# Altium footprint library con-molex.PCBLIB: 368 footprints (part 4 of 26)
Each footprint in its own frame and in the unit in brackets; x right, y up, seen from the top. Pads: shape width x height; smd on the part's side, far side on the other; paste and mask are expansions set on the pad; w line width, h text height; cw(c..) or ccw(c..) is an arc to the next point about the centre after c.
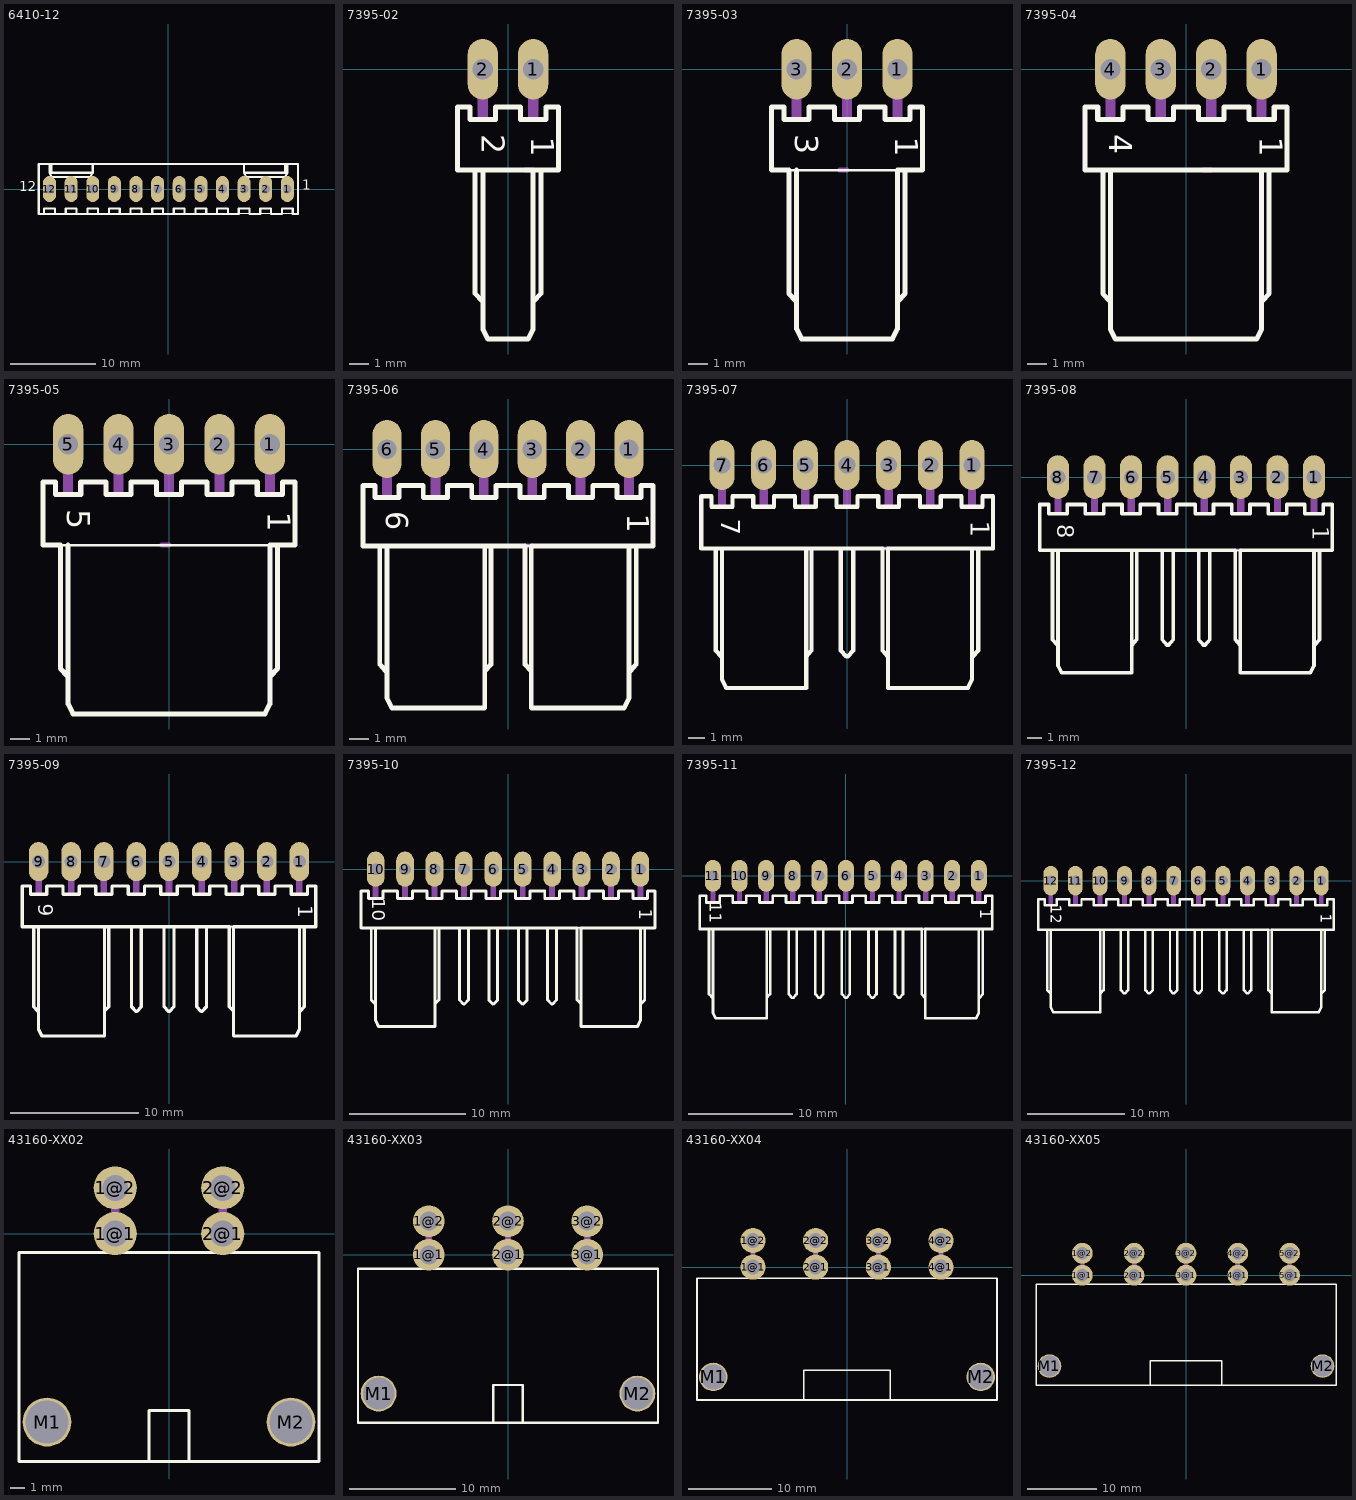
[diagram p3: the footprints below, top view; thin cyan lines are the x and y axes]

## 6410-12 [mil]
pads (12):
  oval 60x120 hole 40: 1(550,0) 2(450,0) 3(350,0) 4(250,0) 5(150,0) 6(50,0) 7(-50,0) 8(-150,0) 9(-250,0) 10(-350,0) 11(-450,0) 12(-550,0)
Top Overlay:
  lines w5: -550,100 -550,115 ; -305,-115 600,-115
  lines w10: -590,-115 -575,-115 -575,-90 -525,-90 -525,-115 -475,-115 -475,-90 -425,-90 -425,-115 -375,-115 -375,-90 -325,-90 -325,-115 325,-115 325,-90 375,-90 375,-115 425,-115 425,-90 475,-90 475,-115 525,-115 525,-90 575,-90 575,-115 600,-115 600,0 600,115 -300,115 -350,115 ; -305,-115 -600,-115 -600,0 -600,115 -550,115 ; -275,-115 -275,-90 -225,-90 -225,-115 ; -175,-115 -175,-90 -125,-90 -125,-115 ; -75,-115 -75,-90 -25,-90 -25,-115 ; 25,-115 25,-90 75,-90 75,-115 ; 125,-115 125,-90 175,-90 175,-115 ; 225,-115 225,-90 275,-90 275,-115 ; 350,115 350,75 ; 540,115 540,75 ; 550,115 550,75 ; -550,75 -550,115 ; -550,75 -540,75 ; -550,75 -540,55 -360,55 -350,75 ; -550,115 -540,115 ; -540,75 -350,75 ; -540,75 -540,115 ; -540,115 -350,115 ; -350,75 -350,115 ; 350,75 540,75 ; 350,75 360,55 540,55 550,75 ; 540,75 550,75
  text "1" at 618.94,-19.06 h77.5
  text "12" at -691.06,-27.06 h77.5
Mechanical 16:
  rectangle: -560,-10 -540,10
  rectangle: -460,-10 -440,10
  rectangle: -360,-10 -340,10
  rectangle: 340,-10 360,10
  rectangle: 440,-10 460,10
  rectangle: 540,-10 560,10
  rectangle: -260,-10 -240,10
  rectangle: 240,-10 260,10
  rectangle: 140,-10 160,10
  rectangle: -160,-10 -140,10
  rectangle: -60,-10 -40,10
  rectangle: 40,-10 60,10

## 7395-02 [mil]
pads (2):
  oval 60x120 hole 40: 1(50,0) 2(-50,0)
Top Overlay:
  lines w10: -52,-459 -65,-445 -65,-200 ; -50,-200 -50,-515 -40,-535 -2,-535 ; 2,-535 -2,-535 ; 52,-459 65,-445 65,-200 ; -65,-200 -100,-200 -100,-75 -75,-75 -75,-100 -25,-100 -25,-75 25,-75 25,-100 75,-100 75,-75 100,-75 100,-200 50,-200 ; -65,-200 50,-200 ; -2,-535 40,-535 50,-515 50,-200
  text "1" at 30.94,-133.94 h77.5
  text "2" at -67.06,-128.94 h77.5
Mechanical 16:
  rectangle: 40,-10 60,10
  rectangle: -60,-10 -40,10
  rectangle: 40,-99 60,-11
  rectangle: -60,-99 -40,-11
  lines w10: 35,-200 50,-200

## 7395-03 [mil]
pads (3):
  oval 60x120 hole 40: 1(100,0) 2(0,0) 3(-100,0)
Top Overlay:
  lines w5: -115,-200 100,-200
  lines w10: -102,-459 -115,-445 -115,-200 -150,-200 -150,-75 -125,-75 -125,-100 -75,-100 -75,-75 -25,-75 -25,-100 25,-100 25,-75 75,-75 75,-100 125,-100 125,-75 150,-75 150,-200 100,-200 100,-515 90,-535 -52,-535 ; -100,-200 -100,-515 -90,-535 -48,-535 ; 102,-459 115,-445 115,-200
  text "1" at 80.94,-133.94 h77.5
  text "3" at -117.06,-128.94 h77.5
Mechanical 16:
  rectangle: 90,-10 110,10
  rectangle: -10,-10 10,10
  rectangle: -110,-10 -90,10
  rectangle: 90,-99 110,-11
  rectangle: -10,-99 10,-11
  rectangle: -110,-99 -90,-11
  lines w10: -15,-200 0,-200

## 7395-04 [mil]
pads (4):
  oval 60x120 hole 40: 1(150,0) 2(50,0) 3(-50,0) 4(-150,0)
Top Overlay:
  lines w10: -152,-459 -165,-445 -165,-200 ; -150,-200 -150,-515 -140,-535 2,-535 ; -2,-535 140,-535 150,-515 150,-200 ; 152,-459 165,-445 165,-200 ; -165,-200 -200,-200 -200,-75 -175,-75 -175,-100 -125,-100 -125,-75 -75,-75 -75,-100 -25,-100 -25,-75 25,-75 25,-100 75,-100 75,-75 125,-75 125,-100 175,-100 175,-75 200,-75 200,-200 150,-200 ; -165,-200 150,-200
  text "1" at 130.94,-133.94 h77.5
  text "4" at -167.06,-128.94 h77.5
Mechanical 16:
  rectangle: 140,-10 160,10
  rectangle: 40,-10 60,10
  rectangle: -60,-10 -40,10
  rectangle: -160,-10 -140,10
  rectangle: 140,-99 160,-11
  rectangle: 40,-99 60,-11
  rectangle: -60,-99 -40,-11
  rectangle: -160,-99 -140,-11
  lines w10: 35,-200 50,-200

## 7395-05 [mil]
pads (5):
  oval 60x120 hole 40: 1(200,0) 2(100,0) 3(0,0) 4(-100,0) 5(-200,0)
Top Overlay:
  lines w5: -215,-200 200,-200
  lines w10: -202,-459 -215,-445 -215,-200 -250,-200 -250,-75 -225,-75 -225,-100 -175,-100 -175,-75 -125,-75 -125,-100 -75,-100 -75,-75 -25,-75 -25,-100 25,-100 25,-75 75,-75 75,-100 125,-100 125,-75 175,-75 175,-100 225,-100 225,-75 250,-75 250,-200 200,-200 200,-515 190,-535 -2,-535 ; -200,-200 -200,-515 -190,-535 2,-535 ; 202,-459 215,-445 215,-200
  text "1" at 180.94,-133.94 h77.5
  text "5" at -217.06,-128.94 h77.5
Mechanical 16:
  rectangle: 190,-10 210,10
  rectangle: 90,-10 110,10
  rectangle: -10,-10 10,10
  rectangle: -110,-10 -90,10
  rectangle: -210,-10 -190,10
  rectangle: 190,-99 210,-11
  rectangle: 90,-99 110,-11
  rectangle: -10,-99 10,-11
  rectangle: -110,-99 -90,-11
  rectangle: -210,-99 -190,-11
  lines w10: -15,-200 0,-200

## 7395-06 [mil]
pads (6):
  oval 60x120 hole 40: 1(250,0) 2(150,0) 3(50,0) 4(-50,0) 5(-150,0) 6(-250,0)
Top Overlay:
  lines w5: 35,-200 48,-200
  lines w10: -252,-459 -265,-445 -265,-200 ; -250,-200 -250,-515 -240,-535 -48,-535 -48,-200 ; -48,-459 -35,-445 -35,-200 ; 252,-459 265,-445 265,-200 ; -265,-200 -300,-200 -300,-75 -275,-75 -275,-100 -225,-100 -225,-75 -175,-75 -175,-100 -125,-100 -125,-75 -75,-75 -75,-100 -25,-100 -25,-75 25,-75 25,-100 75,-100 75,-75 125,-75 125,-100 175,-100 175,-75 225,-75 225,-100 275,-100 275,-75 300,-75 300,-200 250,-200 ; -265,-200 35,-200 35,-445 48,-459 ; 48,-459 48,-535 240,-535 250,-515 250,-200 ; 48,-459 48,-200 250,-200
  text "1" at 230.94,-133.94 h77.5
  text "6" at -267.06,-128.94 h77.5
Mechanical 16:
  rectangle: 240,-10 260,10
  rectangle: 140,-10 160,10
  rectangle: 40,-10 60,10
  rectangle: -60,-10 -40,10
  rectangle: -160,-10 -140,10
  rectangle: -260,-10 -240,10
  rectangle: 240,-99 260,-11
  rectangle: 140,-99 160,-11
  rectangle: 40,-99 60,-11
  rectangle: -60,-99 -40,-11
  rectangle: -160,-99 -140,-11
  rectangle: -260,-99 -240,-11
  lines w10: 35,-200 50,-200

## 7395-07 [mil]
pads (7):
  oval 60x120 hole 40: 1(300,0) 2(200,0) 3(100,0) 4(0,0) 5(-100,0) 6(-200,0) 7(-300,0)
Top Overlay:
  lines w5: 85,-200 98,-200
  lines w10: -302,-459 -315,-445 -315,-200 ; -300,-200 -300,-515 -290,-535 -98,-535 -98,-200 ; -98,-459 -85,-445 -85,-200 ; -2,-459 -15,-445 -15,-200 ; 2,-459 15,-445 15,-200 ; 302,-459 315,-445 315,-200 ; -315,-200 -350,-200 -350,-75 -325,-75 -325,-100 -275,-100 -275,-75 -225,-75 -225,-100 -175,-100 -175,-75 -125,-75 -125,-100 -75,-100 -75,-75 -25,-75 -25,-100 25,-100 25,-75 75,-75 75,-100 125,-100 125,-75 175,-75 175,-100 225,-100 225,-75 275,-75 275,-100 325,-100 325,-75 350,-75 350,-200 300,-200 ; -315,-200 -15,-200 ; -15,-200 85,-200 85,-445 98,-459 ; 98,-459 98,-535 290,-535 300,-515 300,-200 ; 98,-459 98,-200 300,-200
  text "1" at 280.94,-133.94 h77.5
  text "7" at -317.06,-128.94 h77.5
Mechanical 16:
  rectangle: 290,-10 310,10
  rectangle: 190,-10 210,10
  rectangle: 90,-10 110,10
  rectangle: -110,-10 -90,10
  rectangle: -210,-10 -190,10
  rectangle: -310,-10 -290,10
  rectangle: 290,-99 310,-11
  rectangle: 190,-99 210,-11
  rectangle: 90,-99 110,-11
  rectangle: -110,-99 -90,-11
  rectangle: -210,-99 -190,-11
  rectangle: -310,-99 -290,-11
  rectangle: -10,-99 10,-11
  rectangle: -10,-10 10,10
  lines w10: 85,-200 100,-200

## 7395-08 [mil]
pads (8):
  oval 60x120 hole 40: 1(350,0) 2(250,0) 3(150,0) 4(50,0) 5(-50,0) 6(-150,0) 7(-250,0) 8(-350,0)
Top Overlay:
  lines w5: 135,-200 148,-200
  lines w10: -352,-459 -365,-445 -365,-200 ; -350,-200 -350,-515 -340,-535 -148,-535 -148,-200 ; -148,-459 -135,-445 -135,-200 ; -52,-459 -65,-445 -65,-200 ; -48,-459 -35,-445 -35,-200 ; 48,-459 35,-445 35,-200 ; 52,-459 65,-445 65,-200 ; 352,-459 365,-445 365,-200 ; -365,-200 -400,-200 -400,-75 -375,-75 -375,-100 -325,-100 -325,-75 -275,-75 -275,-100 -225,-100 -225,-75 -175,-75 -175,-100 -125,-100 -125,-75 -75,-75 -75,-100 -25,-100 -25,-75 25,-75 25,-100 75,-100 75,-75 125,-75 125,-100 175,-100 175,-75 225,-75 225,-100 275,-100 275,-75 325,-75 325,-100 375,-100 375,-75 400,-75 400,-200 350,-200 ; -365,-200 -65,-200 ; -65,-200 35,-200 ; 35,-200 135,-200 135,-445 148,-459 ; 148,-459 148,-535 340,-535 350,-515 350,-200 ; 148,-459 148,-200 350,-200
  text "1" at 330.94,-133.94 h77.5
  text "8" at -367.06,-128.94 h77.5
Mechanical 16:
  rectangle: 340,-10 360,10
  rectangle: 240,-10 260,10
  rectangle: 140,-10 160,10
  rectangle: -160,-10 -140,10
  rectangle: -260,-10 -240,10
  rectangle: -360,-10 -340,10
  rectangle: 340,-99 360,-11
  rectangle: 240,-99 260,-11
  rectangle: 140,-99 160,-11
  rectangle: -160,-99 -140,-11
  rectangle: -260,-99 -240,-11
  rectangle: -360,-99 -340,-11
  rectangle: 40,-99 60,-11
  rectangle: 40,-10 60,10
  rectangle: -60,-99 -40,-11
  rectangle: -60,-10 -40,10
  lines w10: 135,-200 150,-200

## 7395-09 [mil]
pads (9):
  oval 60x120 hole 40: 1(400,0) 2(300,0) 3(200,0) 4(100,0) 5(0,0) 6(-100,0) 7(-200,0) 8(-300,0) 9(-400,0)
Top Overlay:
  lines w5: 185,-200 198,-200
  lines w10: -402,-459 -415,-445 -415,-200 ; -400,-200 -400,-515 -390,-535 -198,-535 -198,-200 ; -198,-459 -185,-445 -185,-200 ; -102,-459 -115,-445 -115,-200 ; -98,-459 -85,-445 -85,-200 ; -2,-459 -15,-445 -15,-200 ; 2,-459 15,-445 15,-200 ; 98,-459 85,-445 85,-200 ; 102,-459 115,-445 115,-200 ; 402,-459 415,-445 415,-200 ; -415,-200 -450,-200 -450,-75 -425,-75 -425,-100 -375,-100 -375,-75 -325,-75 -325,-100 -275,-100 -275,-75 -225,-75 -225,-100 -175,-100 -175,-75 -125,-75 -125,-100 -75,-100 -75,-75 -25,-75 -25,-100 25,-100 25,-75 75,-75 75,-100 125,-100 125,-75 175,-75 175,-100 225,-100 225,-75 275,-75 275,-100 325,-100 325,-75 375,-75 375,-100 425,-100 425,-75 450,-75 450,-200 400,-200 ; -415,-200 -115,-200 ; -115,-200 -15,-200 ; -15,-200 85,-200 ; 85,-200 185,-200 185,-445 198,-459 ; 198,-459 198,-535 390,-535 400,-515 400,-200 ; 198,-459 198,-200 400,-200
  text "1" at 380.94,-133.94 h77.5
  text "9" at -417.06,-128.94 h77.5
Mechanical 16:
  rectangle: 390,-10 410,10
  rectangle: 290,-10 310,10
  rectangle: 190,-10 210,10
  rectangle: -210,-10 -190,10
  rectangle: -310,-10 -290,10
  rectangle: -410,-10 -390,10
  rectangle: 390,-99 410,-11
  rectangle: 290,-99 310,-11
  rectangle: 190,-99 210,-11
  rectangle: -210,-99 -190,-11
  rectangle: -310,-99 -290,-11
  rectangle: -410,-99 -390,-11
  rectangle: 90,-99 110,-11
  rectangle: 90,-10 110,10
  rectangle: -10,-99 10,-11
  rectangle: -10,-10 10,10
  rectangle: -110,-99 -90,-11
  rectangle: -110,-10 -90,10
  lines w10: 185,-200 200,-200

## 7395-10 [mil]
pads (10):
  oval 60x120 hole 40: 1(450,0) 2(350,0) 3(250,0) 4(150,0) 5(50,0) 6(-50,0) 7(-150,0) 8(-250,0) 9(-350,0) 10(-450,0)
Top Overlay:
  lines w5: 235,-200 248,-200
  lines w10: -452,-459 -465,-445 -465,-200 ; -450,-200 -450,-515 -440,-535 -248,-535 -248,-200 ; -248,-459 -235,-445 -235,-200 ; -152,-459 -165,-445 -165,-200 ; -148,-459 -135,-445 -135,-200 ; -52,-459 -65,-445 -65,-200 ; -48,-459 -35,-445 -35,-200 ; 48,-459 35,-445 35,-200 ; 52,-459 65,-445 65,-200 ; 148,-459 135,-445 135,-200 ; 152,-459 165,-445 165,-200 ; 452,-459 465,-445 465,-200 ; -465,-200 -500,-200 -500,-75 -475,-75 -475,-100 -425,-100 -425,-75 -375,-75 -375,-100 -325,-100 -325,-75 -275,-75 -275,-100 -225,-100 -225,-75 -175,-75 -175,-100 -125,-100 -125,-75 -75,-75 -75,-100 -25,-100 -25,-75 25,-75 25,-100 75,-100 75,-75 125,-75 125,-100 175,-100 175,-75 225,-75 225,-100 275,-100 275,-75 325,-75 325,-100 375,-100 375,-75 425,-75 425,-100 475,-100 475,-75 500,-75 500,-200 450,-200 ; -465,-200 -165,-200 ; -165,-200 -65,-200 ; -65,-200 35,-200 ; 35,-200 135,-200 ; 135,-200 235,-200 235,-445 248,-459 ; 248,-459 248,-535 440,-535 450,-515 450,-200 ; 248,-459 248,-200 450,-200
  text "1" at 430.94,-133.94 h77.5
  text "10" at -477.06,-98.94 h77.5
Mechanical 16:
  rectangle: 440,-10 460,10
  rectangle: 340,-10 360,10
  rectangle: 240,-10 260,10
  rectangle: -260,-10 -240,10
  rectangle: -360,-10 -340,10
  rectangle: -460,-10 -440,10
  rectangle: 440,-99 460,-11
  rectangle: 340,-99 360,-11
  rectangle: 240,-99 260,-11
  rectangle: -260,-99 -240,-11
  rectangle: -360,-99 -340,-11
  rectangle: -460,-99 -440,-11
  rectangle: 140,-99 160,-11
  rectangle: 140,-10 160,10
  rectangle: 40,-99 60,-11
  rectangle: 40,-10 60,10
  rectangle: -160,-99 -140,-11
  rectangle: -160,-10 -140,10
  rectangle: -60,-99 -40,-11
  rectangle: -60,-10 -40,10
  lines w10: 235,-200 250,-200

## 7395-11 [mil]
pads (11):
  oval 60x120 hole 40: 1(500,0) 2(400,0) 3(300,0) 4(200,0) 5(100,0) 6(0,0) 7(-100,0) 8(-200,0) 9(-300,0) 10(-400,0) 11(-500,0)
Top Overlay:
  lines w5: 285,-200 298,-200
  lines w10: -502,-459 -515,-445 -515,-200 ; -500,-200 -500,-515 -490,-535 -298,-535 -298,-200 ; -298,-459 -285,-445 -285,-200 ; -202,-459 -215,-445 -215,-200 ; -198,-459 -185,-445 -185,-200 ; -102,-459 -115,-445 -115,-200 ; -98,-459 -85,-445 -85,-200 ; -2,-459 -15,-445 -15,-200 ; 2,-459 15,-445 15,-200 ; 98,-459 85,-445 85,-200 ; 102,-459 115,-445 115,-200 ; 198,-459 185,-445 185,-200 ; 202,-459 215,-445 215,-200 ; 502,-459 515,-445 515,-200 ; -515,-200 -550,-200 -550,-75 -525,-75 -525,-100 -475,-100 -475,-75 -425,-75 -425,-100 -375,-100 -375,-75 -325,-75 -325,-100 -275,-100 -275,-75 -225,-75 -225,-100 -175,-100 -175,-75 -125,-75 -125,-100 -75,-100 -75,-75 -25,-75 -25,-100 25,-100 25,-75 75,-75 75,-100 125,-100 125,-75 175,-75 175,-100 225,-100 225,-75 275,-75 275,-100 325,-100 325,-75 375,-75 375,-100 425,-100 425,-75 475,-75 475,-100 525,-100 525,-75 550,-75 550,-200 500,-200 ; -515,-200 -215,-200 ; -215,-200 -115,-200 ; -115,-200 -15,-200 ; -15,-200 85,-200 ; 85,-200 185,-200 ; 185,-200 285,-200 285,-445 298,-459 ; 298,-459 298,-535 490,-535 500,-515 500,-200 ; 298,-459 298,-200 500,-200
  text "1" at 490.94,-123.94 h77.5
  text "11" at -527.06,-98.94 h77.5
Mechanical 16:
  rectangle: 490,-10 510,10
  rectangle: 390,-10 410,10
  rectangle: 290,-10 310,10
  rectangle: -310,-10 -290,10
  rectangle: -410,-10 -390,10
  rectangle: -510,-10 -490,10
  rectangle: 490,-99 510,-11
  rectangle: 390,-99 410,-11
  rectangle: 290,-99 310,-11
  rectangle: -310,-99 -290,-11
  rectangle: -410,-99 -390,-11
  rectangle: -510,-99 -490,-11
  rectangle: 190,-99 210,-11
  rectangle: 190,-10 210,10
  rectangle: 90,-99 110,-11
  rectangle: 90,-10 110,10
  rectangle: -210,-99 -190,-11
  rectangle: -210,-10 -190,10
  rectangle: -10,-99 10,-11
  rectangle: -10,-10 10,10
  rectangle: -110,-99 -90,-11
  rectangle: -110,-10 -90,10
  lines w10: 285,-200 300,-200

## 7395-12 [mil]
pads (12):
  oval 60x120 hole 40: 1(550,0) 2(450,0) 3(350,0) 4(250,0) 5(150,0) 6(50,0) 7(-50,0) 8(-150,0) 9(-250,0) 10(-350,0) 11(-450,0) 12(-550,0)
Top Overlay:
  lines w5: 335,-200 348,-200
  lines w10: -552,-459 -565,-445 -565,-200 ; -550,-200 -550,-515 -540,-535 -348,-535 -348,-200 ; -348,-459 -335,-445 -335,-200 ; -252,-459 -265,-445 -265,-200 ; -248,-459 -235,-445 -235,-200 ; -152,-459 -165,-445 -165,-200 ; -148,-459 -135,-445 -135,-200 ; -52,-459 -65,-445 -65,-200 ; -48,-459 -35,-445 -35,-200 ; 48,-459 35,-445 35,-200 ; 52,-459 65,-445 65,-200 ; 148,-459 135,-445 135,-200 ; 152,-459 165,-445 165,-200 ; 248,-459 235,-445 235,-200 ; 252,-459 265,-445 265,-200 ; 552,-459 565,-445 565,-200 ; -565,-200 -600,-200 -600,-75 -575,-75 -575,-100 -525,-100 -525,-75 -475,-75 -475,-100 -425,-100 -425,-75 -375,-75 -375,-100 -325,-100 -325,-75 -275,-75 -275,-100 -225,-100 -225,-75 -175,-75 -175,-100 -125,-100 -125,-75 -75,-75 -75,-100 -25,-100 -25,-75 25,-75 25,-100 75,-100 75,-75 125,-75 125,-100 175,-100 175,-75 225,-75 225,-100 275,-100 275,-75 325,-75 325,-100 375,-100 375,-75 425,-75 425,-100 475,-100 475,-75 525,-75 525,-100 575,-100 575,-75 600,-75 600,-200 550,-200 ; -565,-200 -265,-200 ; -265,-200 -165,-200 ; -165,-200 -65,-200 ; -65,-200 35,-200 ; 35,-200 135,-200 ; 135,-200 235,-200 ; 235,-200 335,-200 335,-445 348,-459 ; 348,-459 348,-535 540,-535 550,-515 550,-200 ; 348,-459 348,-200 550,-200
  text "1" at 530.94,-133.94 h77.5
  text "12" at -567.06,-98.94 h77.5
Mechanical 16:
  rectangle: 540,-10 560,10
  rectangle: 440,-10 460,10
  rectangle: 340,-10 360,10
  rectangle: -360,-10 -340,10
  rectangle: -460,-10 -440,10
  rectangle: -560,-10 -540,10
  rectangle: 540,-99 560,-11
  rectangle: 440,-99 460,-11
  rectangle: 340,-99 360,-11
  rectangle: -360,-99 -340,-11
  rectangle: -460,-99 -440,-11
  rectangle: -560,-99 -540,-11
  rectangle: 240,-99 260,-11
  rectangle: 240,-10 260,10
  rectangle: 140,-99 160,-11
  rectangle: 140,-10 160,10
  rectangle: -260,-99 -240,-11
  rectangle: -260,-10 -240,10
  rectangle: 40,-99 60,-11
  rectangle: 40,-10 60,10
  rectangle: -60,-99 -40,-11
  rectangle: -60,-10 -40,10
  rectangle: -160,-99 -140,-11
  rectangle: -160,-10 -140,10
  lines w10: 335,-200 350,-200

## 43160-XX02 [mm]
pads (6):
  round 3 hole 1.8: 1@1(-3.745,0) 1@2(-3.745,3.18) 2@1(3.745,0) 2@2(3.745,3.18)
  round 3.4 hole 3: M1(-8.495,-13.13) M2(8.495,-13.13)
Top Overlay:
  lines w0.203: -1.4,-15.8 -1.4,-12.325 1.4,-12.325 1.4,-15.85 ; -10.445,-15.885 -10.445,-1.325 10.445,-1.325 10.445,-15.885 -10.445,-15.885
Mechanical 16:
  lines w0.6: -3.745,-1.1 -3.745,3.745 ; 3.745,-1.1 3.745,3.745

## 43160-XX03 [mm]
pads (8):
  round 3 hole 1.8: 1@1(-7.49,0) 1@2(-7.49,3.18) 2@1(0,0) 2@2(0,3.18) 3@1(7.49,0) 3@2(7.49,3.18)
  round 3.4 hole 3: M1(-12.24,-13.13) M2(12.24,-13.13)
Top Overlay:
  lines w0.203: -1.4,-15.8 -1.4,-12.325 1.4,-12.325 1.4,-15.85 ; -14.19,-15.885 -14.19,-1.325 14.19,-1.325 14.19,-15.885 -14.19,-15.885
Mechanical 16:
  lines w0.6: -7.49,-1.1 -7.49,3.745 ; 0,-1.1 0,3.745 ; 7.49,-1.1 7.49,3.745

## 43160-XX04 [mm]
pads (10):
  round 3 hole 1.8: 1@1(-11.235,0) 1@2(-11.235,3.18) 2@1(-3.745,0) 2@2(-3.745,3.18) 3@1(3.745,0) 3@2(3.745,3.18) 4@1(11.235,0) 4@2(11.235,3.18)
  round 3.4 hole 3: M1(-15.985,-13.13) M2(15.985,-13.13)
Top Overlay:
  lines w0.203: -5.175,-15.8 -5.175,-12.325 5.175,-12.325 5.175,-15.85 ; -17.935,-15.885 -17.935,-1.325 17.935,-1.325 17.935,-15.885 -17.935,-15.885
Mechanical 16:
  lines w0.6: -11.235,-1.1 -11.235,3.745 ; -3.745,-1.1 -3.745,3.745 ; 3.745,-1.1 3.745,3.745 ; 11.235,-1.1 11.235,3.745

## 43160-XX05 [mm]
pads (12):
  round 3 hole 1.8: 1@1(-14.98,0) 1@2(-14.98,3.18) 2@1(-7.49,0) 2@2(-7.49,3.18) 3@1(0,0) 3@2(0,3.18) 4@1(7.49,0) 4@2(7.49,3.18) 5@1(14.98,0) 5@2(14.98,3.18)
  round 3.4 hole 3: M1(-19.73,-13.13) M2(19.73,-13.13)
Top Overlay:
  lines w0.203: -5.175,-15.8 -5.175,-12.325 5.175,-12.325 5.175,-15.85 ; -21.68,-15.885 -21.68,-1.325 21.68,-1.325 21.68,-15.885 -21.68,-15.885
Mechanical 16:
  lines w0.6: -14.98,-1.1 -14.98,3.745 ; -7.49,-1.1 -7.49,3.745 ; 0,-1.1 0,3.745 ; 7.49,-1.1 7.49,3.745 ; 14.98,-1.1 14.98,3.745